# Altium footprint library ICL_connectors_v1.PcbLib: 86 footprints (part 3 of 6)
Each footprint in its own frame and in the unit in brackets; x right, y up, seen from the top. Pads: shape width x height; smd on the part's side, far side on the other; paste and mask are expansions set on the pad; w line width, h text height; cw(c..) or ccw(c..) is an arc to the next point about the centre after c.
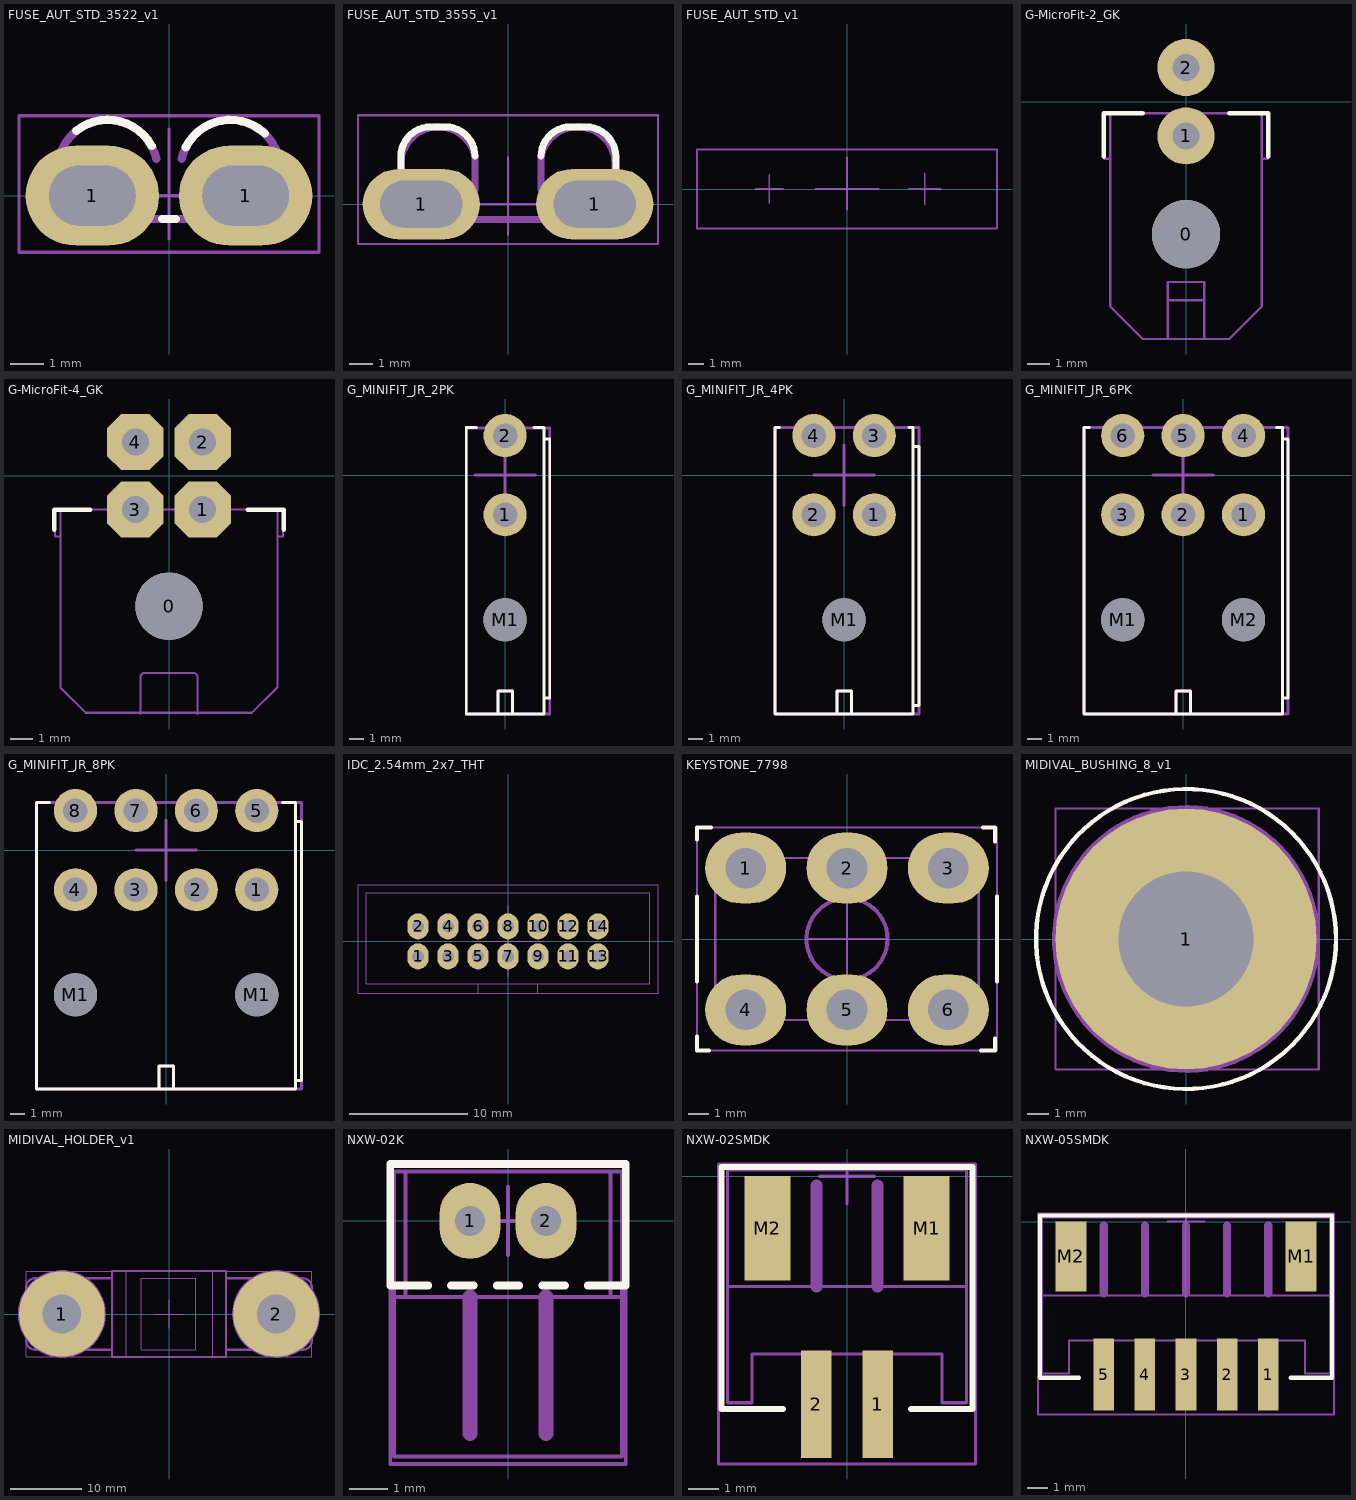
[diagram p2: the footprints below, top view; thin cyan lines are the x and y axes]

## FUSE_AUT_STD_3522_v1 [mm] "std automotive fuse holder (1/2)"
pads (2):
  oval 4x3 hole 1.8 slot 2.6 at 0 deg paste-1: 1(-2.3,0) 1(2.3,0)
Top Overlay:
  lines w0.25: -2.778,1.947 cw(c-1.841,0.775) -0.522,1.488 ; -0.2,-0.7 0.2,-0.7 ; 0.502,1.449 cw(c1.841,0.775) 2.869,1.867
Top M15-16_SORG:
  lines w0.1: -2,0 0,0 ; 0,-1.3 0,0 ; 0,2 0,0 ; 2,0 0,0 ; -4.5,-1.7 4.5,-1.7 4.5,2.4 -4.5,2.4 -4.5,-1.7
Top M17-18_TDES:
  text "'.Designator'" at -5.665,3.183 h1
Top M19-20_TMOT:
  lines w0.25: -0.378,1.105 ccw(c-1.841,0.775) -3.341,0.786 -3.341,-0.7 3.341,-0.7 3.341,0.798 ccw(c1.841,0.775) 0.378,1.105
3D body "keystone-PN3522.STEP": height 7.2, standoff -3.9, extent -3.442,-0.8 3.442,2.374

## FUSE_AUT_STD_3555_v1 [mm] "std automotive fuse holder (1/2)"
pads (2):
  oval 5x3 hole 2 slot 3.5 at 0 deg paste-1: 1(-3.7,0) 1(3.7,0)
Top Overlay:
  lines w0.3: -4.572,0.982 -4.572,2.03 cw(c-3.302,2.03) -3.302,3.3 -2.659,3.3 cw(c-2.659,2.052) -1.411,2.052 ; 1.411,2.052 cw(c2.659,2.052) 2.659,3.3 3.33,3.3 cw(c3.33,2.03) 4.6,2.03 4.6,1.016
Top M15-16_SORG:
  lines w0.1: -2,0 0,0 ; 0,-1.3 0,0 ; 0,2 0,0 ; 2,0 0,0 ; -6.4,-1.7 -6.4,3.8 6.4,3.8 6.4,-1.7 -6.4,-1.7
Top M17-18_TDES:
  text "'.Designator'" at -5.665,4.283 h1
Top M19-20_TMOT:
  lines w0.3: -1.4,0.6 cw(c-1.4,0.611) -1.411,0.611 -1.411,2.052 ccw(c-2.972,1.7) -4.572,1.712 -4.572,0.252 -4.572,-0.048 ccw(c-3.962,-0.048) -3.962,-0.657 3.962,-0.657 ccw(c3.962,-0.048) 4.572,-0.048 4.572,0.252 4.572,1.724 ccw(c2.972,1.7) 1.411,2.052 1.411,0.611
3D body "keystone-PN3555.STEP": height 10.78, standoff -3.9, extent -4.978,-0.865 4.978,3.707

## FUSE_AUT_STD_v1 [mm] "std fuse automotive"
Top M15-16_SORG:
  lines w0.1: -5.818,0 -4.928,0 ; -4.928,-0.89 -4.928,0 ; -4.928,0.89 -4.928,0 ; -4.039,0 -4.928,0 ; -2,0 0,0 ; 0,-1.3 0,0 ; 0,2 0,0 ; 2,0 0,0 ; 3.927,0.008 4.927,0.008 ; 4.928,-1 4.928,0 ; 4.928,1 4.928,0 ; 5.928,0 4.928,0 ; -9.5,-2.5 -9.5,2.5 9.5,2.5 9.5,-2.5 -9.5,-2.5
Top M17-18_TDES:
  text "'.Designator'" at -6.165,3.283 h1
3D body "User Library-fuse_gm.step": height 19.39, standoff 0.01, extent -9.525,-2.54 9.525,2.54

## G-MicroFit-2_GK [mm] "Gniazdo kontowe MicroiFit 2 piny"
pads (3):
  round 3 hole 3: 0(0,-5.8)
  round 2.5 hole 1.2: 1(0,-1.5) 2(0,1.5)
Top Overlay:
  lines w0.2: -3.6,-2.4 -3.6,-0.5 -1.9,-0.5 ; 1.9,-0.5 3.6,-0.5 3.6,-2.4
Top M15-16_SORG:
  lines w0.1: -3.353,-2.5 -3.556,-2.5 -3.556,-0.5 -2.3,-0.5 ; -3.325,-0.6 -3.325,-8.975 -1.9,-10.4 1.9,-10.4 3.325,-8.975 3.325,-0.6 ; -0.8,-10.4 -0.8,-7.9 0.8,-7.9 0.8,-10.4 ; -0.8,-8.7 0.8,-8.7 ; 2.3,-0.5 3.556,-0.5 3.556,-2.5 3.327,-2.5
Top M17-18_TDES:
  text "'.Designator'" at -5.765,-3.717 h1
Top M19-20_TMOT:
  lines w0.1: -3.353,-2.5 -3.556,-2.5 -3.556,-0.5 3.556,-0.5 3.556,-2.5 3.327,-2.5 ; -3.325,-0.5 -3.325,-8.975 -1.9,-10.4 1.9,-10.4 3.325,-8.975 3.325,-0.5 ; -0.8,-10.4 -0.8,-7.9 0.8,-7.9 0.8,-10.4 ; -0.8,-8.7 0.8,-8.7
3D body "MicroFit-2x1-GK.STEP": height 8.78, standoff -3.17, extent -3.575,-10.42 3.575,1.82

## G-MicroFit-4_GK [mm] "Gniazdo kontowe MiniFit 4 piny"
pads (5):
  round 3 hole 3 unplated: 0(0,-5.8)
  oct 2.5x2.5 hole 1.2: 1(1.5,-1.5) 2(1.5,1.5) 3(-1.5,-1.5) 4(-1.5,1.5)
Top Overlay:
  lines w0.2: -5.1,-2.4 -5.1,-1.5 -3.5,-1.5 ; 3.5,-1.5 5.1,-1.5 5.1,-2.4
Top M15-16_SORG:
  lines w0.1: -4.825,-9.432 -4.825,-1.5 ; -4.825,-2.7 -5.075,-2.7 -5.075,-1.5 5.075,-1.5 5.075,-2.7 4.825,-2.7 ; -4.813,-9.432 -3.704,-10.541 3.679,-10.541 4.822,-9.398 ; -1.27,-10.592 -1.27,-8.89 -1.143,-8.763 1.143,-8.763 1.27,-8.89 1.27,-10.592 ; 4.825,-9.398 4.825,-1.5
Top M17-18_TDES:
  text "'.Designator'" at -5.665,-3.717 h1
Top M19-20_TMOT:
  lines w0.1: -4.825,-9.432 -4.825,-1.5 ; -4.825,-2.7 -5.075,-2.7 -5.075,-1.5 5.075,-1.5 5.075,-2.7 4.825,-2.7 ; -4.813,-9.432 -3.704,-10.541 3.679,-10.541 4.822,-9.398 ; -1.27,-10.592 -1.27,-8.89 -1.143,-8.763 1.143,-8.763 1.27,-8.89 1.27,-10.592 ; 4.825,-9.398 4.825,-1.5
3D body "MicroFit_2x2-Gk.stp": height 8.78, standoff -3.17, extent -5.117,-10.462 5.033,1.778

## G_MINIFIT_JR_2PK [mm]
pads (3):
  round 3 hole 1.7: 1(0,-2.75) 2(0,2.75)
  round 3 hole 3 unplated: M1(0,-10.05)
Top Overlay:
  lines w0.2: -2,3.3 -2.7,3.3 -2.7,-16.6 2.7,-16.6 2.7,3.3 2,3.3 ; -0.5,-16.6 -0.5,-15 0.5,-15 0.5,-16.6 ; 2.7,-15.5 3.1,-15.5 3.1,2.5 2.7,2.5
Top M15-16_SORG:
  lines w0.2: -2.1,0 0,0 ; 0,-2.1 0,0 ; 0,2.1 0,0 ; 2.1,0 0,0
Top M17-18_TDES:
  lines w0.2: -0.5,-16.6 -0.5,-15 0.5,-15 0.5,-16.6 ; -2.7,-16.6 -2.7,3.3 -2.7,3.267 3.1,3.267 3.1,-16.6 -2.7,-16.6
  text "'.Designator'" at -5.765,-6.417 h1
3D body "MiniFit_JR_2PK_039301020.stp": height 11.41, standoff -3.59, extent -2.7,-16.668 3.1,3.267

## G_MINIFIT_JR_4PK [mm]
pads (5):
  round 3 hole 1.7: 1(2.1,-2.75) 2(-2.1,-2.75) 3(2.1,2.75) 4(-2.1,2.75)
  round 3 hole 3 unplated: M1(0,-10.05)
Top Overlay:
  lines w0.2: -4.5,3.3 -4.8,3.3 -4.8,-16.6 4.8,-16.6 4.8,3.3 4.5,3.3 ; -0.5,-16.6 -0.5,-15 0.5,-15 0.5,-16.6 ; 4.8,-16 5.2,-16 5.2,2 4.8,2
Top M15-16_SORG:
  lines w0.2: -2.1,0 0,0 ; 0,-2.1 0,0 ; 0,2.1 0,0 ; 2.1,0 0,0
Top M17-18_TDES:
  lines w0.2: -0.5,-16.6 -0.5,-15 0.5,-15 0.5,-16.6 ; -4.8,-16.6 5.2,-16.6 5.2,3.3 -4.8,3.3 -4.8,-16.6
  text "'.Designator'" at -5.765,-5.917 h1
3D body "MiniFit_JR_4PK_039301040.stp": height 11.41, standoff -3.59, extent -4.8,-16.7 5.2,3.235

## G_MINIFIT_JR_6PK [mm]
pads (8):
  round 3 hole 1.7: 1(4.2,-2.75) 2(0,-2.75) 3(-4.2,-2.75) 4(4.2,2.75) 5(0,2.75) 6(-4.2,2.75)
  round 3 hole 3 unplated: M1(-4.2,-10.05) M2(4.2,-10.05)
Top Overlay:
  lines w0.2: -6.5,3.3 -6.9,3.3 -6.9,-16.6 6.9,-16.6 6.9,3.3 6.5,3.3 ; -0.5,-16.6 -0.5,-15 0.5,-15 0.5,-16.6 ; 6.9,-15.5 7.3,-15.5 7.3,2.5 6.9,2.5
Top M15-16_SORG:
  lines w0.2: -2.1,0 0,0 ; 0,-2.1 0,0 ; 0,2.1 0,0 ; 2.1,0 0,0
Top M17-18_TDES:
  lines w0.2: -0.5,-16.6 -0.5,-15 0.5,-15 0.5,-16.6 ; -6.9,-16.6 -6.9,3.3 7.3,3.3 7.3,1.6 7.3,-16.6 -6.9,-16.6
  text "'.Designator'" at -5.765,-6.117 h1
3D body "MiniFit_Jr_6P_039301060.stp": height 11.41, standoff -3.59, extent -6.9,-16.635 7.3,3.3

## G_MINIFIT_JR_8PK [mm]
pads (10):
  round 3 hole 1.7: 1(6.3,-2.75) 2(2.1,-2.75) 3(-2.1,-2.75) 4(-6.3,-2.75) 5(6.3,2.75) 6(2.1,2.75) 7(-2.1,2.75) 8(-6.3,2.75)
  round 3 hole 3 unplated: M1(-6.3,-10.05) M1(6.3,-10.05)
Top Overlay:
  lines w0.2: -8.1,3.3 -9,3.3 -9,-16.6 9,-16.6 9,3.3 8.1,3.3 ; -0.5,-16.6 -0.5,-15 0.5,-15 0.5,-16.6 ; 9,-16 9.4,-16 9.4,2 9,2
Top M15-16_SORG:
  lines w0.2: -2.1,0 0,0 ; 0,-2.1 0,0 ; 0,2.1 0,0 ; 2.1,0 0,0
Top M17-18_TDES:
  lines w0.2: -9,3.3 9.4,3.3 9.4,-16.6 -9,-16.6 -9,3.272 ; -0.5,-16.6 -0.5,-15 0.5,-15 0.5,-16.6
  text "'.Designator'" at -5.665,-6.917 h1
3D body "MiniFit_JR_8P_039301080.stp": height 11.41, standoff -3.59, extent -9,-16.663 9.4,3.272

## IDC_2.54mm_2x7_THT [mm]
pads (14):
  oval 1.8x2.2 hole 1 paste-1: 1(-7.62,-1.27) 2(-7.62,1.27) 3(-5.08,-1.27) 4(-5.08,1.27) 5(-2.54,-1.27) 6(-2.54,1.27) 7(0,-1.27) 8(0,1.27) 9(2.54,-1.27) 10(2.54,1.27) 11(5.08,-1.27) 12(5.08,1.27) 13(7.62,-1.27) 14(7.62,1.27)
Top M15-16_SORG:
  lines w0.1: -2.989,0.007 3.011,0.007 ; -2.5,-4.4 -2.5,-3.6 2.5,-3.6 2.5,-4.4 ; 0,-3 0,3 ; -12.7,-4.4 12.7,-4.4 12.7,4.8 -12.7,4.8 -12.7,-4.4
Top M17-18_TDES:
  text "'.Designator'" at -5.665,3.283 h1
Top M19-20_TMOT:
  lines w0.1: -12.7,-4.4 -12.7,4.8 12.7,4.8 12.7,-4.4 2.5,-4.4 2.5,-3.6 12,-3.6 12,4.1 -12,4.1 -12,-3.6 -2.5,-3.6 -2.5,-4.4 -12.7,-4.4
3D body "61201421621_IDC_THT_2x7_2_54mm.stp": height 9.11, standoff -2.99, extent -12.72,-4.425 12.72,4.75

## KEYSTONE_7798 [mm] "M4 30A"
pads (6):
  oval 4x3.5 hole 2 paste-1: 1(-5,3.5) 2(0,3.5) 3(5,3.5) 4(-5,-3.5) 5(0,-3.5) 6(5,-3.5)
Top Overlay:
  lines w0.2: -7.4,-4.8 -7.4,-5.5 -6.8,-5.5 ; -7.4,-2.1 -7.4,2.1 ; -7.4,4.9 -7.4,5.5 -6.7,5.5 ; 6.6,-5.5 7.3,-5.5 7.3,-4.9 ; 6.7,5.5 7.3,5.5 7.3,4.8 ; 7.4,-2.1 7.4,2.1
Top M15-16_SORG:
  lines w0.1: -2,0 0,0 ; 0,-2 0,0 ; 0,2 0,0 ; 2,0 0,0 ; -6.5,-4 -6.5,4 6.5,4 6.5,-4 -6.5,-4
Top M17-18_TDES:
  text "'.Designator'" at -5.765,-0.217 h1
Top M19-20_TMOT:
  circle w0.2: c0,0 r2
  lines w0.1: -7.4,-5.5 -7.4,5.5 7.4,5.5 7.4,-5.5 -7.4,-5.5
3D body "keystone-PN7798.STEP": height 6.36, standoff -5.32, extent -6.439,-4.527 6.439,4.527

## MIDIVAL_BUSHING_8_v1 [mm] "bushing for fuse holder"
pads (1):
  round 12 hole 6.2: 1(0,0)
Top Overlay:
  circle w0.2: c0,0 r6.888
Top M15-16_SORG:
  lines w0.1: -2,0 0,0 ; 0,-2 0,0 ; 0,2 0,0 ; 2,0 0,0 ; -6,-6 -6,6 6.1,6 6.1,-6 -6,-6
Top M17-18_TDES:
  text "'.Designator'" at -5.565,-7.817 h1
Top M19-20_TMOT:
  circle w0.3: c0,0 r3
  circle w0.3: c0,0 r6
  lines w0.1: -6,0.2 -0.2,6 ; -5.95,-0.65 0.7,6 ; -5.8,-1.4 1.4,5.8 ; -5.8,1.3 -1.3,5.8 ; -5.65,-2.15 -2.95,0.55 ; -5.4,2.6 -2.6,5.4 ; -5.35,-2.75 -3,-0.4 ; -5,-3.3 -2.85,-1.15 ; -4.55,-3.75 -2.5,-1.7 ; -4.15,-4.25 -2.1,-2.2 ; -3.7,-4.7 -1.55,-2.55 ; -3.2,-5.1 -0.95,-2.85 ; -2.55,-5.35 -0.2,-3 ; -1.95,-5.65 0.8,-2.9 ; -1.2,-5.9 5.794,1.306 ; -0.5,3 2.1,5.6 ; -0.407,-5.993 5.946,0.552 ; 0.4,3 2.7,5.3 ; 0.543,-5.945 6.011,-0.311 ; 1.1,2.8 3.3,5 ; 1.621,-5.721 5.857,-1.358 ; 1.7,2.5 3.8,4.6 ; 2.2,2.1 4.3,4.2 ; 2.6,1.6 4.7,3.7 ; 2.77,-0.93 5.65,1.95 ; 2.85,0.95 5.1,3.2 ; 3.003,-5.203 5.22,-2.919 ; 3.05,0.25 5.4,2.6
3D body "tuleja_MidiVal_v1.stp": height 8.15, standoff 0.15, extent -6,-6 6,6

## MIDIVAL_HOLDER_v1 [mm] "midival fuse holder"
pads (2):
  round 12 hole 5.4: 1(-15,0) 2(15,0)
Top M15-16_SORG:
  lines w0.1: -2,0 0,0 ; 0,-2 0,0 ; 0,2 0,0 ; 2,0 0,0 ; -20,-6 -20,6 20,6 20,-6 -20,-6
Top M17-18_TDES:
  text "'.Designator'" at -5.765,-0.217 h1
Top M19-20_TMOT:
  circle w0.3: c15,0 r6
  circle w0.3: c-15,0 r6
  lines w0.1: -6,-6 -6,6 ; 6.1,-6 6.1,6 ; -3.891,-5 3.776,-5 3.776,5 -3.891,5 -3.891,-5
  lines w0.3: -8,-5 -18.73,-5 cw(c-18.73,-3.73) -20,-3.73 -20,3.73 cw(c-18.73,3.73) -18.73,5 -8,5 ; -8,-5 -8,5 ; -8,-5 -8,-6 8,-6 8,-5 ; -8,5 -8,6 8,6 8,5 ; 8,-5 18.73,-5 ccw(c18.73,-3.73) 20,-3.73 20,3.73 ccw(c18.73,3.73) 18.73,5 8,5 ; 8,-5 8,5
3D body: height 0.1, standoff 0, extent -21,-6 -9,6
3D body: height 0.1, standoff 0, extent 9,-6 21,6

## NXW-02K [mm] "2mm angle THT"
pads (2):
  oval 1.6x2 hole 0.8 paste-1: 1(-1,0) 2(1,0)
Top Overlay:
  lines w0.2: -2.1,-1.7 -3.1,-1.7 -3.1,1.5 3.1,1.5 3.1,-1.7 2.1,-1.7 ; -1.5,-1.7 -0.9,-1.7 ; -0.3,-1.7 0.3,-1.7 ; 0.9,-1.7 1.5,-1.7
Top M17-18_TDES:
  text "'.Designator'" at -6.365,2.283 h1
Top M19-20_TMOT:
  lines w0.1: -3,-2 3,-2 ; -2.7,-2 -2.7,1.3 ; 2.7,-2 2.7,1.3 ; -3,-6.2 3,-6.2 3,1.3 -3,1.3 -3,-6.2
  lines w0.4: -1,-5.6 -1,-2 ; 1,-5.6 1,-2
Top M25-26_TORG:
  lines w0.1: -0.9,0 0.9,0 ; 0,-0.9 0,0.9 ; -3.1,-6.4 3.1,-6.4 3.1,1.5 -3.1,1.5 -3.1,-6.4
3D body "User Library-S2B.step": height 4.81, standoff -3.39, extent -2.95,-6.25 2.95,1.35

## NXW-02SMDK [mm] "2mm angle SMD"
pads (4):
  rect 1x3.5 smd paste-1: 1(1,-7.45) 2(-1,-7.45)
  rect 1.5x3.4 smd paste-1: M1(2.6,-1.7) M2(-2.6,-1.7)
Top Overlay:
  lines w0.2: -2.1,-7.6 -4.1,-7.6 -4.1,0.3 4.1,0.3 4.1,-7.6 2.1,-7.6
Top M11-12_SMOT:
  rectangle: -1.3,-8.4 -0.7,-5.8
  rectangle: 0.7,-8.4 1.3,-5.8
  lines w0.1: -3.9,-3.6 3.9,-3.6 ; -3.9,-7.4 -3.9,0.2 3.9,0.2 3.9,-7.4 3.1,-7.4 3.1,-5.8 -3.1,-5.8 -3.1,-7.4 -3.9,-7.4
  lines w0.4: -1,-3.6 -1,-0.3 ; 1,-3.6 1,-0.3
Top M13-14_SDES:
  text "'.Designator'" at -5.665,-4.917 h1
Top M15-16_SORG:
  lines w0.1: -0.9,0 0.9,0 ; 0,-0.9 0,0.4 ; -4.2,-9.4 -4.2,0.4 4.2,0.4 4.2,-9.4 -4.2,-9.4
3D body "User Library-S2B-PH-SM4-TB.step": height 5.61, standoff 0.01, extent -3.95,-8.4 3.95,0.2

## NXW-05SMDK [mm] "2mm angle SMD"
pads (7):
  rect 1x3.5 smd paste-1: 1(4,-7.45) 2(2,-7.45) 3(0,-7.45) 4(-2,-7.45) 5(-4,-7.45)
  rect 1.5x3.4 smd paste-1: M1(5.6,-1.7) M2(-5.6,-1.7)
Top Overlay:
  lines w0.2: -5.2,-7.6 -7.1,-7.6 -7.1,0.3 7.1,0.3 7.1,-7.6 5.1,-7.6
Top M11-12_SMOT:
  rectangle: -4.3,-8.4 -3.7,-5.8
  rectangle: 1.7,-8.4 2.3,-5.8
  rectangle: 3.7,-8.4 4.3,-5.8
  rectangle: -2.3,-8.4 -1.7,-5.8
  rectangle: -0.3,-8.4 0.3,-5.8
  lines w0.1: -7,-3.6 7,-3.6 ; -7,-7.4 -7,0.2 7,0.2 7,-7.4 5.8,-7.4 5.8,-5.8 -5.7,-5.8 -5.7,-7.4 -7,-7.4
  lines w0.4: -4,-3.5 -4,-0.2 ; -2,-3.5 -2,-0.2 ; 0,-3.5 0,-0.2 ; 2,-3.5 2,-0.2 ; 4,-3.5 4,-0.2
Top M13-14_SDES:
  text "'.Designator'" at -5.665,-4.917 h1
Top M15-16_SORG:
  lines w0.1: -0.9,0 0.9,0 ; 0,-0.9 0,0.4 ; -7.2,-9.4 -7.2,0.4 7.2,0.4 7.2,-9.4 -7.2,-9.4
3D body "User Library-S5B-PH-SM4-TB.step": height 4.81, standoff 0.01, extent -5.95,-8.4 5.95,0.2